# Altium footprint library Lib_Global.PcbLib: 96 footprints (part 5 of 6)
Each footprint in its own frame and in the unit in brackets; x right, y up, seen from the top. Pads: shape width x height; smd on the part's side, far side on the other; paste and mask are expansions set on the pad; w line width, h text height; cw(c..) or ccw(c..) is an arc to the next point about the centre after c.
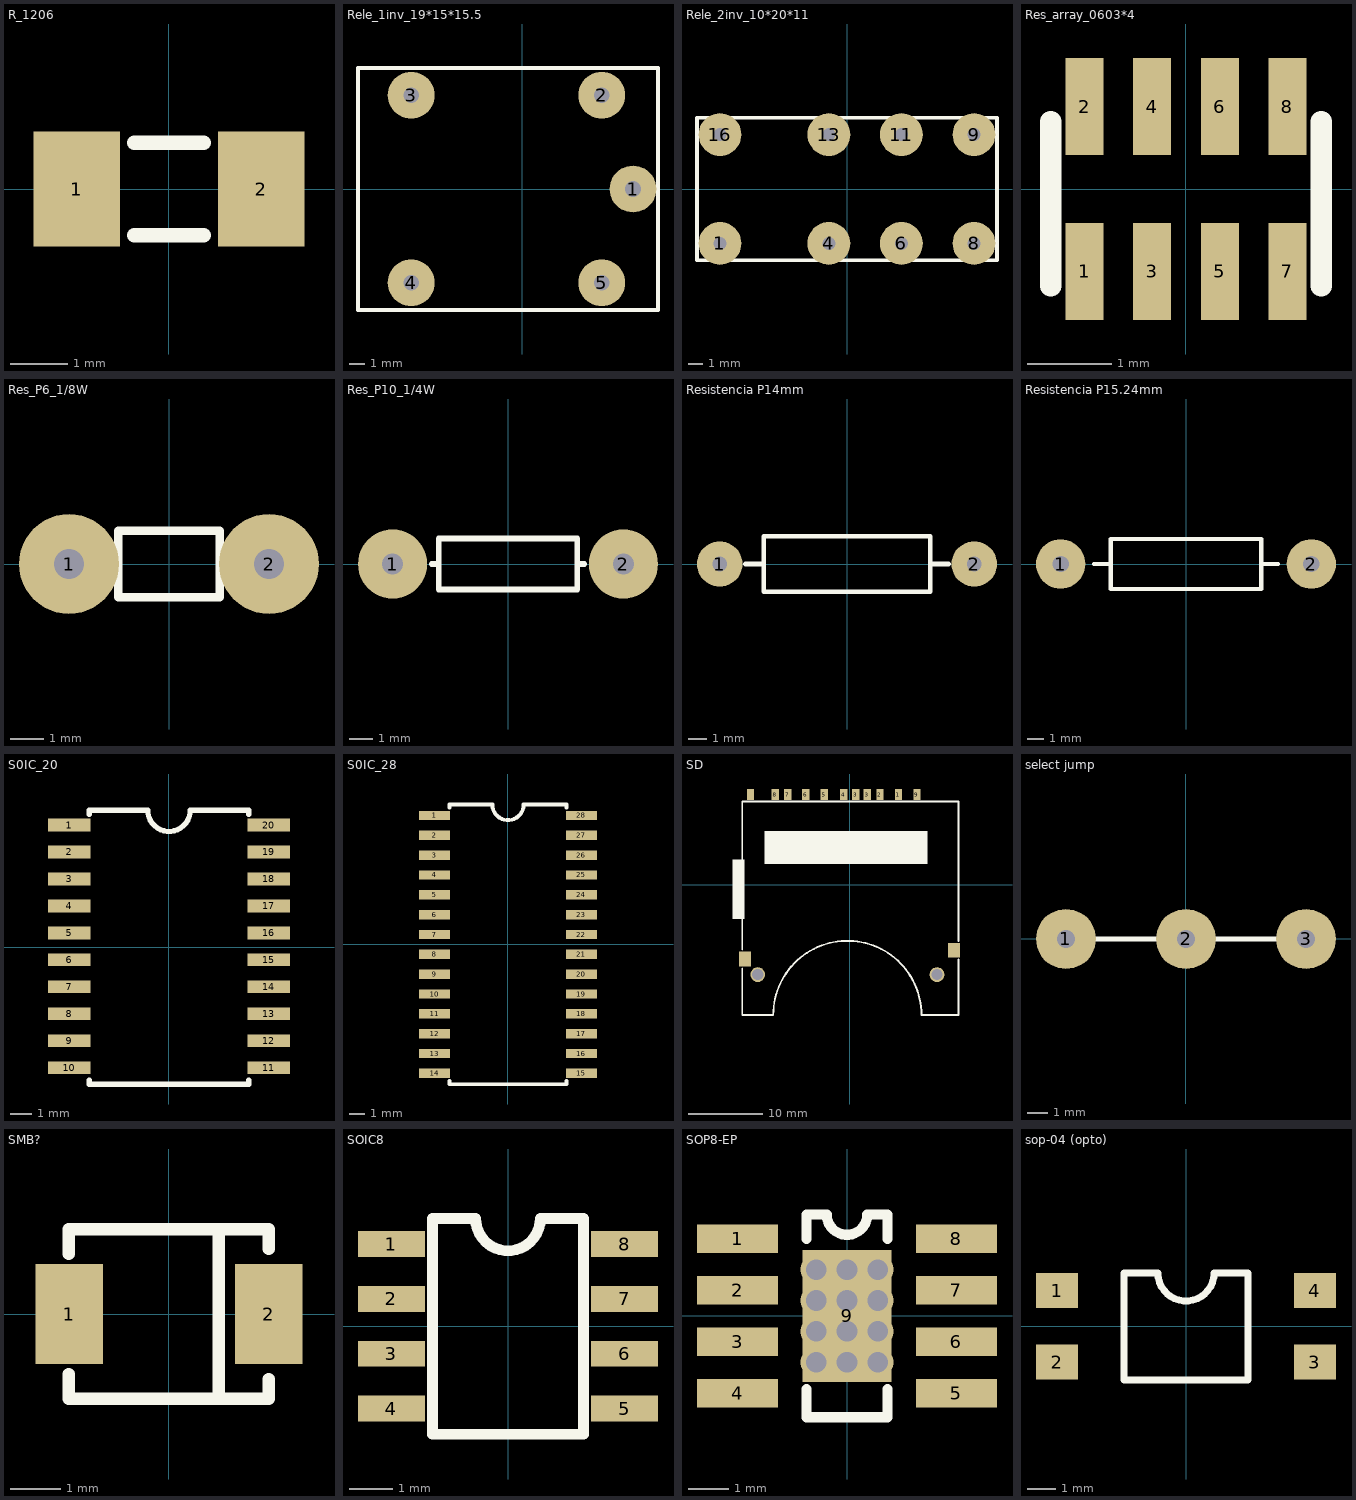
[diagram p4: the footprints below, top view; thin cyan lines are the x and y axes]

## R_1206 [mm]
pads (2):
  rect 1.5x2 smd: 1(-1.6,0) 2(1.6,0)
Top Overlay:
  lines w0.25: -0.6,-0.8 0.6,-0.8 ; -0.6,0.8 0.6,0.8
3D body "User Library-RES_3216-1206.sldprt": height 0.85, standoff 0, extent -1.675,-0.865 1.675,0.865

## Rele_1inv_19*15*15.5 [mm]
pads (5):
  round 3 hole 1: 1(7.1,0) 2(5.1,6) 3(-7.1,6) 4(-7.1,-6) 5(5.1,-6)
Top Overlay:
  lines w0.254: -10.5,-7.75 -10.5,7.75 8.7,7.75 8.7,-7.75 -10.5,-7.75
3D body "User Library-relay_songle_Relay SPDT Songle.sldprt": height 15.3, standoff -5, extent -10.65,-7.75 8.45,7.75

## Rele_2inv_10*20*11 [mm]
pads (8):
  round 3 hole 0.9: 1(-8.89,-3.81) 4(-1.27,-3.81) 6(3.81,-3.81) 8(8.89,-3.81) 9(8.89,3.81) 11(3.81,3.81) 13(-1.27,3.81) 16(-8.89,3.81)
Top Overlay:
  lines w0.25: -10.5,-5 10.5,-5 10.5,5 -10.5,5 -10.5,-5
3D body "User Library-rly_dpdt_20x9_8x12mm.sldprt": height 12.05, standoff -3.5, extent -10,-4.9 10,4.9
3D body: height 1, standoff -1, extent -4.09,0.59 -4.09,0.59

## Res_array_0603*4 [mm]
pads (8):
  rect 0.45x1.15 smd: 1(-1.2,-0.975) 2(-1.2,0.975) 3(-0.4,-0.975) 4(-0.4,0.975) 5(0.4,-0.975) 6(0.4,0.975) 7(1.2,-0.975) 8(1.2,0.975)
Top Overlay:
  lines w0.25: -1.6,-1.15 -1.6,0.8 ; 1.6,-1.15 1.6,0.8

## Res_P6_1/8W [mm]
pads (2):
  round 3 hole 0.9: 1(-3,0) 2(3,0)
Top Overlay:
  lines w0.25: -1.824,0 -1.524,0 ; 1.524,0 1.905,0 ; -1.524,-1 1.524,-1 1.524,1 -1.524,1 -1.524,-1
3D body "User Library-Res_1-8w_1_2.sldprt": height 1.9, standoff -2, extent -3.2,-0.889 3.2,0.911

## Res_P10_1/4W [mm]
pads (2):
  round 3 hole 0.9: 1(-5,0) 2(5,0)
Top Overlay:
  lines w0.25: -3.3,0 -3,0 ; 3,0 3.3,0 ; -3,-1.1 -3,1.1 3,1.1 3,-1.1 -3,-1.1
3D body "User Library-1_4 Watt.sldprt": height 2.18, standoff -3.9, extent -5.335,-1.083 5.334,1.085

## Resistencia P14mm [mm]
pads (2):
  round 2.5 hole 0.8 mask+0.5: 1(-7,0) 2(7,0)
Top Overlay:
  lines w0.25: -5.588,0 -4.572,0 ; 4.572,0 5.588,0 ; -4.572,-1.524 -4.572,1.524 4.572,1.524 4.572,-1.524 -4.572,-1.524

## Resistencia P15.24mm [mm]
pads (2):
  round 3 hole 1: 1(-7.62,0) 2(7.62,0)
Top Overlay:
  lines w0.25: -5.588,0 -4.572,0 ; 4.572,0 5.588,0 ; -4.572,-1.524 4.572,-1.524 4.572,1.524 -4.572,1.524 -4.572,-1.524
3D body "User Library-PR02.sldprt": height 3.95, standoff -8.43, extent -8,-1.947 8.04,1.947

## S0IC_20 [mm]
pads (20):
  rect 2x0.6 smd mask+0.102: 1(-4.7,5.755) 2(-4.7,4.485) 3(-4.7,3.215) 4(-4.7,1.945) 5(-4.7,0.675) 6(-4.7,-0.595) 7(-4.7,-1.865) 8(-4.7,-3.135) 9(-4.7,-4.405) 10(-4.7,-5.675) 11(4.7,-5.675) 12(4.7,-4.405) 13(4.7,-3.135) 14(4.7,-1.865) 15(4.7,-0.595) 16(4.7,0.675) 17(4.7,1.945) 18(4.7,3.215) 19(4.7,4.485) 20(4.7,5.755)
Top Overlay:
  lines w0.25: -3.75,-6.25 -3.75,-6.45 3.75,-6.45 3.75,-6.25 ; -3.75,6.25 -3.75,6.45 -1,6.45 ccw(c0,6.45) 1,6.45 3.75,6.45 3.75,6.25
  text "." at -4.1,6.305 h1.8
3D body: height 0.25, standoff 0, extent -4.7,-5.7 4.8,5.8

## S0IC_28 [mm]
pads (28):
  rect 2x0.6 smd mask+0.102: 1(-4.7,8.255) 2(-4.7,6.985) 3(-4.7,5.715) 4(-4.7,4.445) 5(-4.7,3.175) 6(-4.7,1.905) 7(-4.7,0.635) 8(-4.7,-0.635) 9(-4.7,-1.905) 10(-4.7,-3.175) 11(-4.7,-4.445) 12(-4.7,-5.715) 13(-4.7,-6.985) 14(-4.7,-8.255) 15(4.7,-8.255) 16(4.7,-6.985) 17(4.7,-5.715) 18(4.7,-4.445) 19(4.7,-3.175) 20(4.7,-1.905) 21(4.7,-0.635) 22(4.7,0.635) 23(4.7,1.905) 24(4.7,3.175) 25(4.7,4.445) 26(4.7,5.715) 27(4.7,6.985) 28(4.7,8.255)
Top Overlay:
  lines w0.25: -3.75,-8.75 -3.75,-8.95 3.75,-8.95 3.75,-8.75 ; -3.75,8.75 -3.75,8.95 -1,8.95 ccw(c0,8.95) 1,8.95 3.75,8.95 3.75,8.75
  text "." at -4.1,8.805 h1.8
3D body "User Library-SOIC28-300.SLDPRT": height 2.65, standoff 0, extent -5.15,-8.95 5.15,8.95

## SD [mm]
pads (15):
  rect 1x1.5 smd: 1(6.6,12.155) 2(4.1,12.155) 3(0.85,12.155) 3(2.4,12.155) 4(-0.8,12.155) 5(-3.4,12.155) 6(-5.9,12.155) 7(-8.33,12.155) 8(-10.03,12.155) 9(9.1,12.155) ""(-13.38,12.155)
  rect 1.6x2 smd: ""(-14.1,-10.055) ""(14.1,-8.855)
  round 2 hole 1.5: ""(-12.4,-12.155) ""(11.8,-12.155)
Top Overlay:
  rectangle: -15.8,-4.645 -14.2,3.355
  rectangle: -11.5,2.755 10.5,7.255
  lines w0.25: -14.5,-17.6 -14.5,-11.3 ; -14.5,-17.595 -10.3,-17.595 cw(c-0.3,-17.595) 9.7,-17.595 14.7,-17.595 14.7,-10.1 ; -14.5,-8.8 -14.5,11.205 14.7,11.205 ; 14.7,-7.6 14.7,11.2
3D body "socket_a-sd-09-c-a-1-3.SLDPRT": height 2.65, standoff -0.7, extent -14.375,-17.625 14.425,12.675

## select jump [mm]
pads (3):
  round 3 hole 0.9: 1(-6,0) 2(0,0) 3(6,0)
Top Overlay:
  lines w0.25: -6,0 6,0

## SMB? [mm]
pads (2):
  rect 1.35x2 smd: 1(-2,0) 2(2,0)
Top Overlay:
  lines w0.25: -2,-1.2 -2,-1.3 -2,-1.7 2,-1.7 2,-1.3 ; -2,1.2 -2,1.7 2,1.7 2,1.3 ; 1,-1.7 1,1.7

## SOIC8 [mm]
pads (8):
  rect 1.55x0.6 smd mask+0.1: 1(-2.7,1.905) 2(-2.7,0.635) 3(-2.7,-0.635) 4(-2.7,-1.905) 5(2.7,-1.905) 6(2.7,-0.635) 7(2.7,0.635) 8(2.7,1.905)
Top Overlay:
  lines w0.25: -1.75,-2.5 1.75,-2.5 1.75,2.5 0.75,2.5 cw(c0,2.5) -0.75,2.5 -1.75,2.5 -1.75,-2.5
3D body "User Library-so8-3.sldprt": height 1.7, standoff 0, extent -3,-2.45 3,2.45

## SOP8-EP [mm]
pads (9):
  rect 2x0.7 smd: 1(-2.7,1.905) 2(-2.7,0.635) 3(-2.7,-0.635) 4(-2.7,-1.905) 5(2.7,-1.905) 6(2.7,-0.635) 7(2.7,0.635) 8(2.7,1.905)
  rect 2.2x3.25 smd: 9(0,0)
via -0.762,-1.143 diameter 0.762 hole 0.508
via 0.762,-0.381 diameter 0.762 hole 0.508
via -0.762,0.381 diameter 0.762 hole 0.508
via -0.762,1.143 diameter 0.762 hole 0.508
via 0,1.143 diameter 0.762 hole 0.508
via -0.762,-0.381 diameter 0.762 hole 0.508
via 0,-0.381 diameter 0.762 hole 0.508
via 0,0.381 diameter 0.762 hole 0.508
via 0.762,0.381 diameter 0.762 hole 0.508
via 0.762,1.143 diameter 0.762 hole 0.508
via 0.762,-1.143 diameter 0.762 hole 0.508
via 0,-1.143 diameter 0.762 hole 0.508
Top Overlay:
  lines w0.25: -1,-1.8 -1,-2.5 1,-2.5 1,-1.8 ; -1,1.9 -1,2.5 -0.5,2.5 ccw(c0,2.5) 0.5,2.5 1,2.5 1,1.9

## sop-04 (opto) [mm]
pads (4):
  rect 1.5x1.25 smd: 1(-4.58,1.27) 2(-4.58,-1.27) 3(4.58,-1.27) 4(4.58,1.27)
Top Overlay:
  lines w0.25: -2.2,-1.9 2.2,-1.9 2.2,1.9 1,1.9 cw(c0,1.9) -1,1.9 -2.2,1.9 -2.2,-1.9
3D body "User Library-PC817 Gullwing Assembly.sldprt": height 3.85, standoff 0, extent -5,-2.29 5,2.29